# Altium footprint library through.PcbLib: 30 footprints (part 2 of 2)
Each footprint in its own frame and in the unit in brackets; x right, y up, seen from the top. Pads: shape width x height; smd on the part's side, far side on the other; paste and mask are expansions set on the pad; w line width, h text height; cw(c..) or ccw(c..) is an arc to the next point about the centre after c.
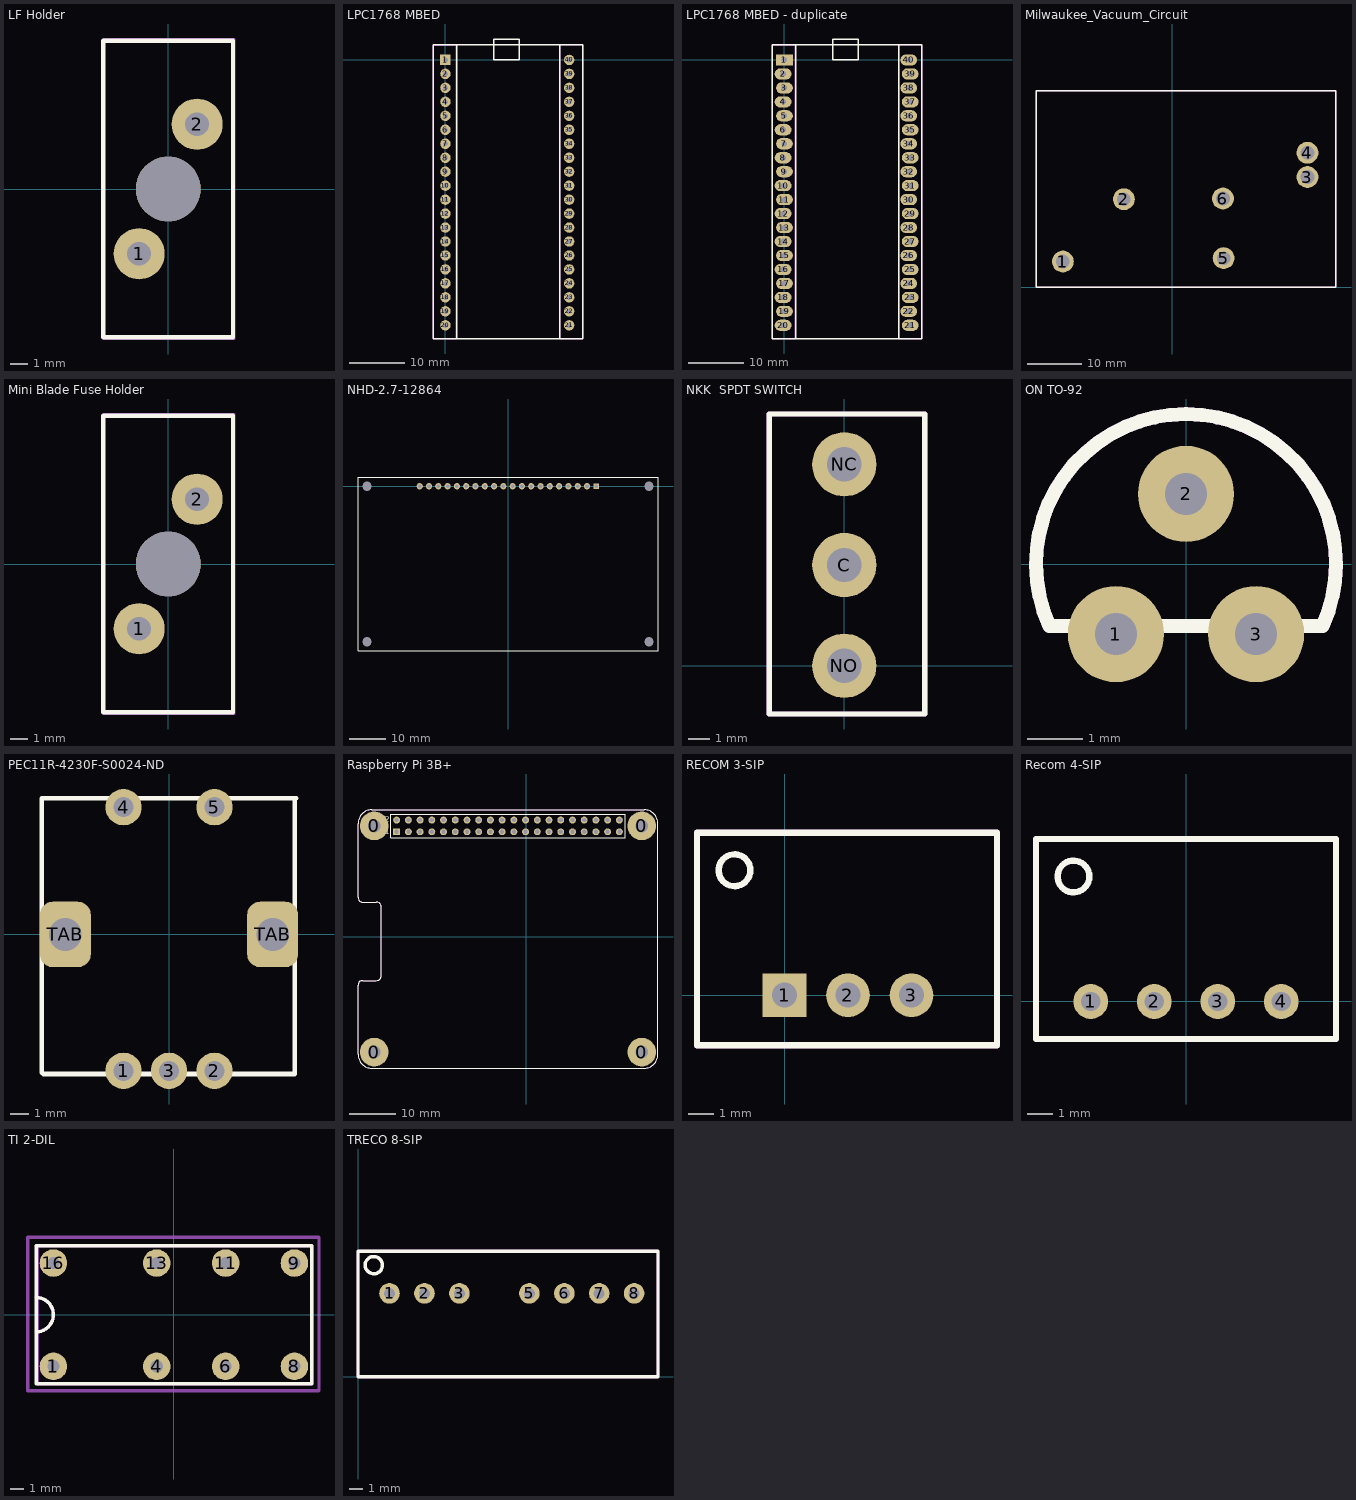
[diagram p1: the footprints below, top view; thin cyan lines are the x and y axes]

## LF Holder [mm]
pads (3):
  round 3 hole 1.4: 1(-1.7,-3.8) 2(1.7,3.8)
  round 3.8 hole 3.8 unplated: ""(0,0)
Top Overlay:
  lines w0.254: -3.8,-8.7 3.8,-8.7 3.8,8.7 -3.8,8.7 -3.8,-8.7
Mechanical 13:
  lines w0.1: -3.8,-8.8 -3.8,8.8 3.9,8.8 3.9,-8.8 -3.8,-8.8
Mechanical 15:
  lines w0.1: -3.775,-8.725 3.85,-8.725 3.85,8.725 -3.775,8.725 -3.775,-8.725
3D body "fuse holder.STEP": height 19.8, standoff -3.9, extent -3.8,-8.65 3.8,8.65

## LPC1768 MBED [mm] "MBED M3 (40 pin dip package)"
height 2
pads (40):
  rect 1.9x1.9 hole 0.889: 1(0,0)
  round 1.9 hole 0.889: 2(0,-2.54) 3(0,-5.08) 4(0,-7.62) 5(0,-10.16) 6(0,-12.7) 7(0,-15.24) 8(0,-17.78) 9(0,-20.32) 10(0,-22.86) 11(0,-25.4) 12(0,-27.94) 13(0,-30.48) 14(0,-33.02) 15(0,-35.56) 16(0,-38.1) 17(0,-40.64) 18(0,-43.18) 19(0,-45.72) 20(0,-48.26) 21(22.5,-48.26) 22(22.5,-45.72) 23(22.5,-43.18) 24(22.5,-40.64) 25(22.5,-38.1) 26(22.5,-35.56) 27(22.5,-33.02) 28(22.5,-30.48) 29(22.5,-27.94) 30(22.5,-25.4) 31(22.5,-22.86) 32(22.5,-20.32) 33(22.5,-17.78) 34(22.5,-15.24) 35(22.5,-12.7) 36(22.5,-10.16) 37(22.5,-7.62) 38(22.5,-5.08) 39(22.5,-2.54) 40(22.5,0)
Top Overlay:
  lines w0.254: 2.032,-50.75 2.032,2.667 ; 20.75,-50.75 20.75,2.75 ; -2.25,-50.75 -2.25,2.794 25,2.794 25,-50.75 -2.25,-50.75 ; 8.763,0 13.462,0 13.462,3.81 8.763,3.81 8.763,1.143 8.763,0
Mechanical 13:
  lines w0.254: -2.25,-50.75 -1.9,-50.75 2,-50.75 2,2.7 -2.25,2.7 -2.25,-50.75 ; 20.75,-50.7 25,-50.7 25,2.8 20.75,2.8 20.75,-50.7
3D body "MBED.STEP": height 16.84, standoff 5.2, extent -1.75,-50.5 24.25,5.283
3D body: height 8, standoff 0, extent -2.25,-50.75 2,2.75
3D body: height 8, standoff 0, extent 20.75,-50.673 25,2.794

## LPC1768 MBED - duplicate [mil] "MBED M3 (40 pin dip package)"
height 78.74
pads (40):
  rect 120x80 hole 40: 1(0,0)
  oval 120x80 hole 40: 2(-10,-100) 3(0,-200) 4(-10,-300) 5(0,-400) 6(-10,-500) 7(0,-600) 8(-10,-700) 9(0,-800) 10(-10,-900) 11(0,-1000) 12(-10,-1100) 13(0,-1200) 14(-10,-1300) 15(0,-1400) 16(-10,-1500) 17(0,-1600) 18(-10,-1700) 19(0,-1800) 20(-10,-1900) 21(900,-1900) 22(890,-1800) 23(900,-1700) 24(890,-1600) 25(900,-1500) 26(890,-1400) 27(900,-1300) 28(890,-1200) 29(900,-1100) 30(890,-1000) 31(900,-900) 32(890,-800) 33(900,-700) 34(890,-600) 35(900,-500) 36(890,-400) 37(900,-300) 38(890,-200) 39(900,-100) 40(890,0)
Top Overlay:
  lines w10: 80,-1998.03 80,105 ; 816.93,-1998.03 816.93,108.27 ; -88.58,-1998.03 984.25,-1998.03 984.25,110 -88.58,110 -88.58,-1998.03 ; 345,0 345,45 345,150 530,150 530,0 345,0
Mechanical 13:
  lines w10: -88.58,-1998.03 -88.58,106.3 78.74,106.3 78.74,-1998.03 -74.8,-1998.03 -88.58,-1998.03 ; 816.93,-1996.06 816.93,110.24 984.25,110.24 984.25,-1996.06 816.93,-1996.06
3D body: height 314.96, standoff 0, extent 816.93,-1995 984.25,110
3D body: height 314.96, standoff 0, extent -88.58,-1998.03 78.74,108.27
3D body "MBED.STEP": height 663.15, standoff 204.8, extent -68.9,-1988.19 954.72,207.98

## Milwaukee_Vacuum_Circuit [mm]
height 50
pads (6):
  round 4 hole 2.5: 1(-20.066,4.699) 2(-8.89,16.129) 3(24.765,20.193) 4(24.765,24.638) 5(9.398,5.334) 6(9.271,16.256)
Top Overlay:
  lines w0.254: -25,0 30,0 30,36 -25,36 -25,0
Mechanical 15:
  lines w0.254: -25,0 -25,36 30,36 30,0 -25,0
3D body "milwaukeebms.STEP": height 48, standoff 6.5, extent -23.495,1.651 28.505,34.651

## Mini Blade Fuse Holder [mm]
pads (3):
  round 3 hole 1.4: 1(-1.7,-3.8) 2(1.7,3.8)
  round 3.8 hole 3.8 unplated: ""(0,0)
Top Overlay:
  lines w0.254: -3.8,-8.7 -3.8,8.7 3.8,8.7 3.8,-8.7 -3.8,-8.7
Mechanical 13:
  lines w0.1: -3.8,-8.8 3.9,-8.8 3.9,8.8 -3.8,8.8 -3.8,-8.8
Mechanical 15:
  lines w0.1: -3.775,-8.725 -3.775,8.725 3.85,8.725 3.85,-8.725 -3.775,-8.725
3D body "fuse holder.STEP": height 19.8, standoff -3.9, extent -3.8,-8.65 3.8,8.65

## NHD-2.7-12864 [mm]
pads (24):
  rect 1.524x1.524 hole 1: 1(24.13,0)
  round 1.7 hole 1: 2(21.59,0) 3(19.05,0) 4(16.51,0) 5(13.97,0) 6(11.43,0) 7(8.89,0) 8(6.35,0) 9(3.81,0) 10(1.27,0) 11(-1.27,0) 12(-3.81,0) 13(-6.35,0) 14(-8.89,0) 15(-11.43,0) 16(-13.97,0) 17(-16.51,0) 18(-19.05,0) 19(-21.59,0) 20(-24.13,0)
  round 0 hole 2.5 unplated: STANDOFF(-38.5,-42.5) STANDOFF(-38.5,0) STANDOFF(38.5,-42.5) STANDOFF(38.5,0)
Top Overlay:
  lines w0.254: -41,-45 -41,2.5 41,2.5 41,-45 -41,-45
3D body "NHD 2-7.step": height 6, standoff 0, extent -41,-45 41,2.5

## NKK  SPDT SWITCH [mm]
pads (3):
  round 3 hole 1.6: C(0,4.7) NC(0,9.4) NO(0,0)
Top Overlay:
  lines w0.254: -3.5,-2.25 -3.5,11.75 3.75,11.75 3.75,-2.25 -3.5,-2.25
Mechanical 13:
  lines w0.254: -3.5,-2.25 3.75,-2.25 3.75,11.75 -3.5,11.75 -3.5,-2.25
Mechanical 15:
  lines w0.254: -3.5,-2.25 3.75,-2.25 3.75,11.75 -3.5,11.75 -3.5,-2.25
3D body "CS12ANW03.stp": height 3.8, standoff -14.11, extent -3.505,-2.298 3.81,11.698

## ON TO-92 [mm]
pads (3):
  round 1.75 hole 0.762: 1(-1.275,-1.275) 2(0,1.275) 3(1.275,-1.275)
Top Overlay:
  lines w0.254: -2.484,-1.129 cw(c0,0) 2.484,-1.129 ; -2.475,-1.125 2.475,-1.125
Mechanical 13:
  lines w0.254: -2.484,-1.129 cw(c0,0) 2.484,-1.129 ; -2.475,-1.125 2.475,-1.125
Mechanical 15:
  lines w0.254: -2.484,-1.129 cw(c0,0) 2.484,-1.129 ; -2.475,-1.125 2.475,-1.125
3D body "TO-92.step": height 5.92, standoff -2.39, extent -2.481,-1.63 2.471,2.472

## PEC11R-4230F-S0024-ND [mm]
pads (7):
  round 2 hole 1.1: 1(-2.5,-7.5) 2(2.5,-7.5) 3(0,-7.5) 4(-2.5,7) 5(2.5,7)
  rrect50% 2.8x3.6 hole 1.8 square: TAB(-5.7,0) TAB(5.7,0)
Top Overlay:
  lines w0.254: -7,-7.599 -6.924,-7.675 6.924,-7.675 6.924,7.424 7,7.5 -7,7.5 -7,-7.599
3D body "pec11r-4215k_l13-8_w12-4_h21-5.stp": height 21.7, standoff -3.5, extent -6.924,-7.675 6.924,7.175

## Raspberry Pi 3B+ [mm]
pads (44):
  round 6.2 hole 2.75 unplated: 0(-33,-25) 0(-33,24) 0(25,-25) 0(25,24)
  rect 1.5x1.5 hole 0.9: 1(-28.13,22.73)
  round 1.5 hole 0.9: 2(-28.13,25.27) 3(-25.59,22.73) 4(-25.59,25.27) 5(-23.05,22.73) 6(-23.05,25.27) 7(-20.51,22.73) 8(-20.51,25.27) 9(-17.97,22.73) 10(-17.97,25.27) 11(-15.43,22.73) 12(-15.43,25.27) 13(-12.89,22.73) 14(-12.89,25.27) 15(-10.35,22.73) 16(-10.35,25.27) 17(-7.81,22.73) 18(-7.81,25.27) 19(-5.27,22.73) 20(-5.27,25.27) 21(-2.73,22.73) 22(-2.73,25.27) 23(-0.19,22.73) 24(-0.19,25.27) 25(2.35,22.73) 26(2.35,25.27) 27(4.89,22.73) 28(4.89,25.27) 29(7.43,22.73) 30(7.43,25.27) 31(9.97,22.73) 32(9.97,25.27) 33(12.51,22.73) 34(12.51,25.27) 35(15.05,22.73) 36(15.05,25.27) 37(17.59,22.73) 38(17.59,25.27) 39(20.13,22.73) 40(20.13,25.27)
Top Overlay:
  lines w0.127: -36.5,-25.5 ccw(c-33.5,-25.5) -33.5,-28.5 25.5,-28.5 ccw(c25.5,-25.5) 28.5,-25.5 28.5,24.5 ccw(c25.5,24.5) 25.5,27.5 -33.5,27.5 ccw(c-33.5,24.5) -36.5,24.5 -36.5,8.5 ccw(c-35.5,8.5) -35.5,7.5 -32.5,7.5 cw(c-32.5,6.5) -31.5,6.5 -31.5,-8.5 cw(c-32.5,-8.5) -32.5,-9.5 -35.5,-9.5 ccw(c-35.5,-10.5) -36.5,-10.5 -36.5,-25.5
  lines w0.2: -29.4,21.46 21.4,21.46 21.4,26.54 -29.4,26.54 -29.4,21.46
  text "1" at -30.67,22.222 h1.27
  text "2" at -30.67,24.762 h1.27
  text "40" at 22.162,24.762 h1.27
  text "39" at 22.162,22.222 h1.27
Mechanical 1:
  lines w0.127: -36.5,-25.5 ccw(c-33.5,-25.5) -33.5,-28.5 25.5,-28.5 ccw(c25.5,-25.5) 28.5,-25.5 28.5,24.5 ccw(c25.5,24.5) 25.5,27.5 -33.5,27.5 ccw(c-33.5,24.5) -36.5,24.5 -36.5,8.5 ccw(c-35.5,8.5) -35.5,7.5 -32.5,7.5 cw(c-32.5,6.5) -31.5,6.5 -31.5,-8.5 cw(c-32.5,-8.5) -32.5,-9.5 -35.5,-9.5 ccw(c-35.5,-10.5) -36.5,-10.5 -36.5,-25.5
3D body "female_header_a-bl254-dg-z32d.stp": height 8.5, standoff -3.2, extent -29.525,21.627 11.365,26.627
3D body "female_header_a-bl254-dg-z32d.stp": height 8.5, standoff -3.2, extent -19.365,21.625 21.525,26.625
3D body "raspberryPi3B.SLDPRT": height 3.55, standoff -15.5, extent -36.479,-31.003 50.521,27.497

## RECOM 3-SIP [mm] "12 to 42 Vdc In, 9 Vdc Out"
height 8.5
pads (3):
  rect 1.75x1.75 hole 1: 1(0,0)
  round 1.75 hole 1: 2(2.54,0) 3(5.08,0)
Top Overlay:
  circle w0.254: c-2,5 r0.635
  lines w0.254: -3.5,-2 8.5,-2 8.5,6.5 -3.5,6.5 -3.5,-2
Mechanical 13:
  lines w0.254: -3.5,-2 -3.5,6.5 8.5,6.5 8.5,-2 -3.5,-2
Mechanical 15:
  lines w0.254: -3.5,-2 -3.5,6.5 8.5,6.5 8.5,-2 -3.5,-2
3D body "rb78c.STEP": height 11.41, standoff -3.1, extent -3.262,-2.022 8.338,6.478

## Recom 4-SIP [mil]
pads (4):
  round 55 hole 30: 1(-150,0) 2(-50,0) 3(50,0) 4(150,0)
Top Overlay:
  circle w10: c-177.17,196.85 r25
  lines w10: -236.22,-59.06 236.22,-59.06 236.22,255.91 -236.22,255.91 -236.22,-59.06
Mechanical 13:
  lines w10: -236.22,-59.06 236.22,-59.06 236.22,255.91 -236.22,255.91 -236.22,-59.06
Mechanical 15:
  lines w10: -236.22,-59.06 236.22,-59.06 236.22,255.91 -236.22,255.91 -236.22,-59.06
3D body "ridc-dc.STEP": height 122.05, standoff -441.34, extent -225.43,-50.57 227.32,248.64

## TI 2-DIL [mil]
height 708.66
pads (8):
  round 80 hole 35.43: 1(-350,-150) 4(-50,-150) 6(150,-150) 8(350,-150) 9(350,150) 11(150,150) 13(-50,150) 16(-350,150)
Top Overlay:
  lines w10: -400,-50 ccw(c-400,0) -400,50 ; -400,-200 400,-200 400,200 -400,200 -400,-200
Mechanical 13:
  lines w10: -400,-50 ccw(c-400,0) -400,50 ; -400,200 400,200 400,-200 -395.28,-200 -397.64,-197.64 -397.64,196.85
Mechanical 15:
  lines w10: -425.2,-220.47 421.26,-220.47 421.26,224.41 -425.2,224.41 -425.2,-220.47
3D body "TI 2-DIL.stp": height 450, standoff -109.06, extent -397.64,-196.85 397.64,196.85

## TRECO 8-SIP [mm]
pads (7):
  round 1.5 hole 0.8: 1(2.29,6.05) 2(4.83,6.05) 3(7.37,6.05) 5(12.45,6.05) 6(14.99,6.05) 7(17.53,6.05) 8(20.07,6.05)
Top Overlay:
  circle w0.254: c1.15,8.1 r0.626
  lines w0.254: 0,0 0,9.1 21.8,9.1 21.8,0 0,0
Mechanical 15:
  lines w0.254: 0,0 0,9.1 21.8,9.1 21.8,0 0,0
3D body "tmr3wi.stp": height 11.2, standoff -4.1, extent 0,0 21.798,9.098